# Altium footprint library FOC.PcbLib: 148 footprints (part 5 of 10)
Each footprint in its own frame and in the unit in brackets; x right, y up, seen from the top. Pads: shape width x height; smd on the part's side, far side on the other; paste and mask are expansions set on the pad; w line width, h text height; cw(c..) or ccw(c..) is an arc to the next point about the centre after c.
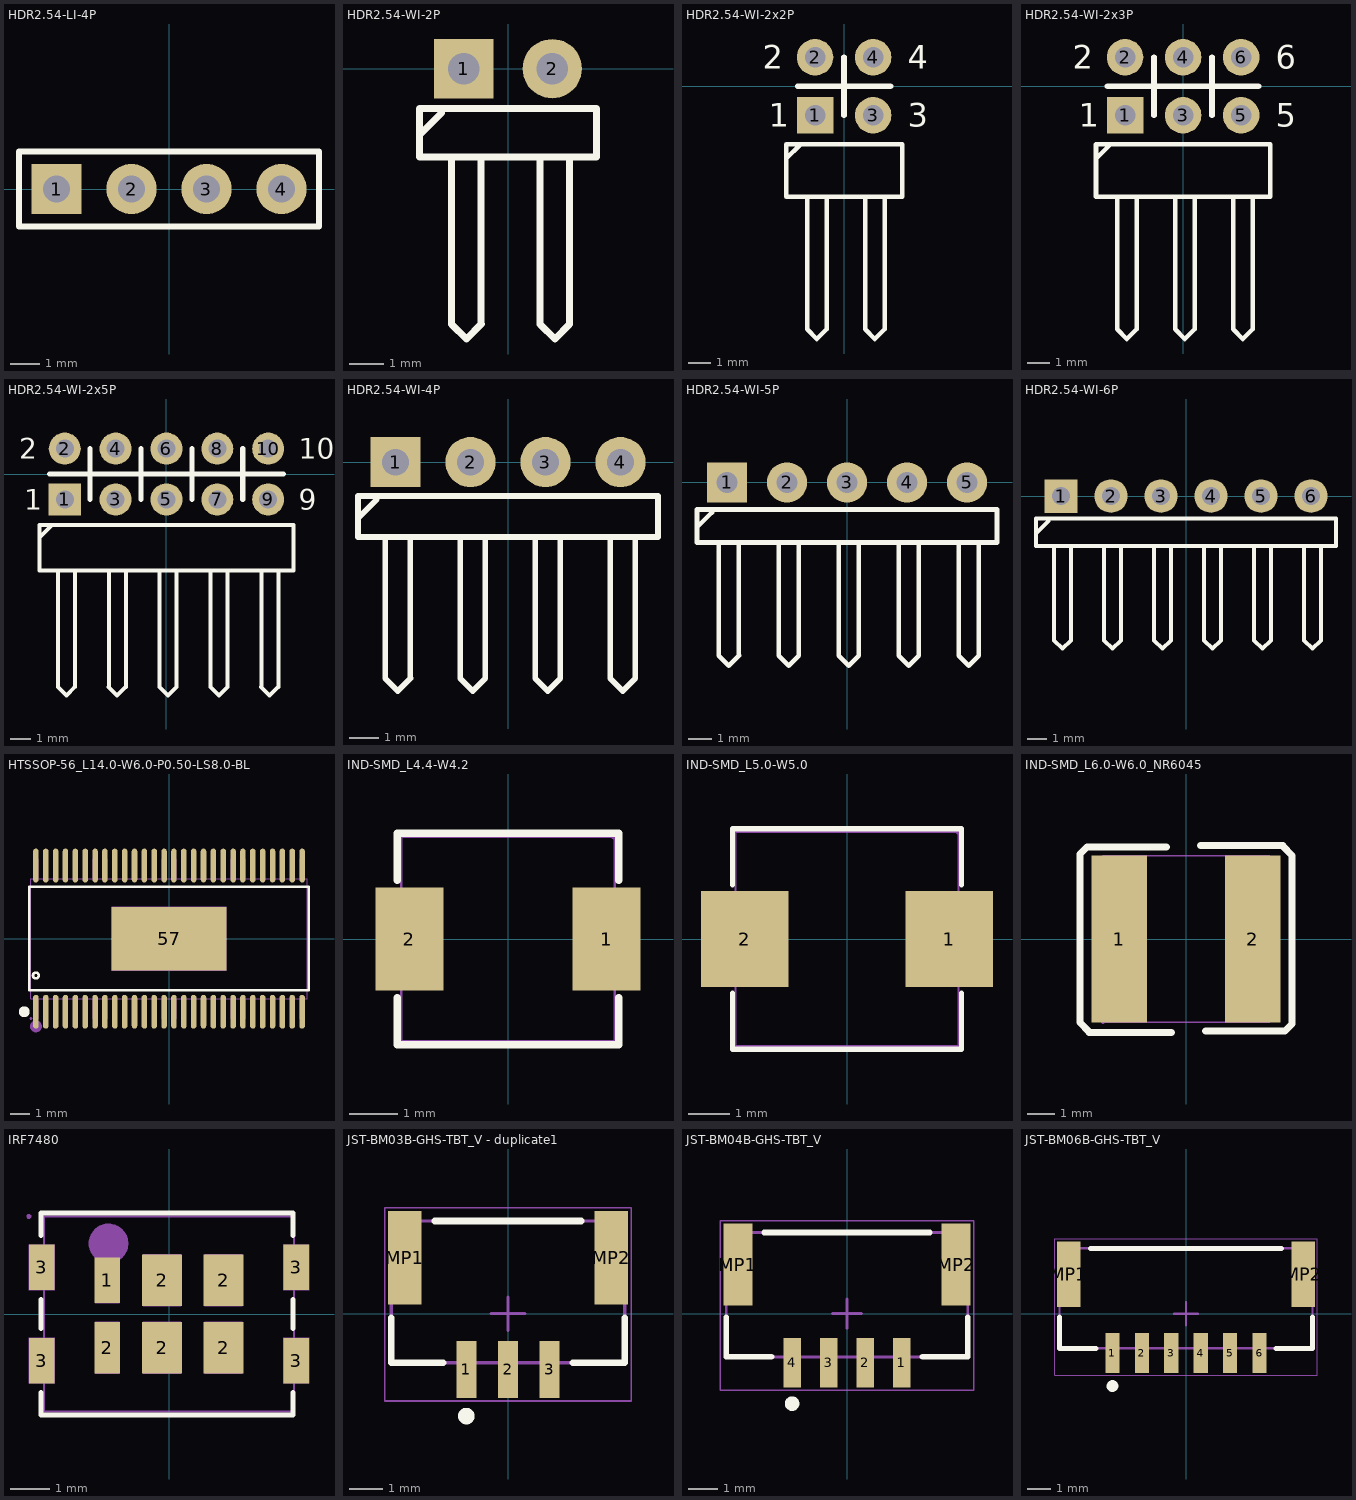
[diagram p4: the footprints below, top view; thin cyan lines are the x and y axes]

## HDR2.54-LI-4P [mm] "排针，4脚"
pads (4):
  rect 1.7x1.7 hole 0.9: 1(-3.81,0)
  round 1.7 hole 0.9: 2(-1.27,0) 3(1.27,0) 4(3.81,0)
Top Overlay:
  lines w0.2: -5.08,-1.27 5.08,-1.27 5.08,1.27 -5.08,1.27 -5.08,-1.27
3D body "HDR2.54-1P.STEP": height 2.54, standoff -8.96, extent -5.08,-1.27 -2.54,1.27
3D body "HDR2.54-1P.STEP": height 2.54, standoff -8.96, extent -2.54,-1.27 0,1.27
3D body "HDR2.54-1P.STEP": height 2.54, standoff -8.96, extent 0,-1.27 2.54,1.27
3D body "HDR2.54-1P.STEP": height 2.54, standoff -8.96, extent 2.54,-1.27 5.08,1.27

## HDR2.54-WI-2P [mm] "弯脚排针，2脚"
pads (2):
  rect 1.7x1.7 hole 0.9: 1(-1.27,0)
  round 1.7 hole 0.9: 2(1.27,0)
Top Overlay:
  lines w0.2: -2.54,-1.905 -1.905,-1.27 ; -1.618,-2.54 -1.618,-7.332 -1.195,-7.755 -0.771,-7.332 -0.762,-7.323 ; -0.771,-7.323 -0.771,-2.54 ; 0.922,-2.54 0.922,-7.332 1.345,-7.755 1.769,-7.332 ; 1.769,-7.323 1.769,-2.54 ; -2.54,-2.54 2.54,-2.54 2.54,-1.143 -0.762,-1.143 -2.54,-1.143 -2.54,-2.54
3D body "HDR2.54-1P_H.STEP": height 4.85, standoff -3, extent -2.54,-7.77 0,1.27
3D body "HDR2.54-1P_H.STEP": height 4.85, standoff -3, extent 0,-7.77 2.54,1.27

## HDR2.54-WI-2x2P [mm] "双排弯脚排针，2x2脚"
pads (4):
  rect 1.6x1.6 hole 0.9: 1(-1.27,-1.27)
  round 1.6 hole 0.9: 2(-1.27,1.27) 3(1.27,-1.27) 4(1.27,1.27)
Top Overlay:
  lines w0.2: -2.54,-3.175 -1.905,-2.54 ; -1.618,-10.634 -1.195,-11.057 -0.771,-10.634 -0.762,-10.625 -0.762,-4.826 ; -1.609,-10.634 -1.609,-4.826 ; 0.922,-10.634 1.345,-11.057 1.769,-10.634 ; 0.931,-10.634 0.931,-4.826 ; 1.778,-10.634 1.778,-4.826 ; -2.54,-4.826 -2.54,-2.54 2.54,-2.54 2.54,-4.826 -2.54,-4.826
  lines w0.254: -2.032,0 2.032,0 ; 0,-1.27 0,1.27
  text "3" at 2.794,-1.778 h1.02
  text "4" at 2.794,0.762 h1.02
  text "2" at -3.556,0.762 h1.02
  text "1" at -3.302,-1.778 h1.02
Bottom Overlay:
  lines w0.254: -2.032,0 2.032,0 ; 0,-1.27 0,1.27
3D body "HDR-1x2_H.STEP": height 5.1, standoff -3, extent -2.54,-11.23 0,1.62
3D body "HDR-1x2_H.STEP": height 5.1, standoff -3, extent 0,-11.23 2.54,1.62

## HDR2.54-WI-2x3P [mm] "双排弯脚排针，3x2脚"
pads (6):
  rect 1.6x1.6 hole 0.9: 1(-2.54,-1.27)
  round 1.6 hole 0.9: 2(-2.54,1.27) 3(0,-1.27) 4(0,1.27) 5(2.54,-1.27) 6(2.54,1.27)
Top Overlay:
  lines w0.2: -3.81,-3.175 -3.175,-2.54 ; -2.888,-10.634 -2.465,-11.057 -2.041,-10.634 -2.032,-10.625 -2.032,-4.826 ; -2.879,-10.634 -2.879,-4.826 ; -0.348,-10.634 0.075,-11.057 0.499,-10.634 ; -0.339,-10.634 -0.339,-4.826 ; 0.508,-10.634 0.508,-4.826 ; 2.192,-10.634 2.615,-11.057 3.039,-10.634 ; 2.201,-10.634 2.201,-4.826 ; 3.048,-10.634 3.048,-4.826 ; -3.81,-4.826 3.81,-4.826 3.81,-2.54 -3.81,-2.54 -3.81,-4.826
  lines w0.254: -3.302,0 3.302,0 ; -1.27,-1.27 -1.27,1.27 ; 1.27,-1.27 1.27,1.27
  text "6" at 4.064,0.762 h1.02
  text "5" at 4.064,-1.778 h1.02
  text "2" at -4.826,0.762 h1.02
  text "1" at -4.572,-1.778 h1.02
Bottom Overlay:
  lines w0.254: -3.302,0 3.302,0 ; -1.27,-1.27 -1.27,1.27 ; 1.27,-1.27 1.27,1.27
3D body "HDR-1x2_H.STEP": height 5.1, standoff -3, extent -1.27,-11.23 1.27,1.62
3D body "HDR-1x2_H.STEP": height 5.1, standoff -3, extent -3.81,-11.23 -1.27,1.62
3D body "HDR-1x2_H.STEP": height 5.1, standoff -3, extent 1.27,-11.23 3.81,1.62

## HDR2.54-WI-2x5P [mm] "双排弯脚排针，5x2脚"
pads (10):
  rect 1.6x1.6 hole 0.9: 1(-5.08,-1.27)
  round 1.6 hole 0.9: 2(-5.08,1.27) 3(-2.54,-1.27) 4(-2.54,1.27) 5(0,-1.27) 6(0,1.27) 7(2.54,-1.27) 8(2.54,1.27) 9(5.08,-1.27) 10(5.08,1.27)
Top Overlay:
  lines w0.2: -6.35,-3.175 -5.715,-2.54 ; -5.428,-10.634 -5.005,-11.057 -4.581,-10.634 -4.572,-10.625 -4.572,-4.826 ; -5.419,-10.634 -5.419,-4.826 ; -2.888,-10.634 -2.465,-11.057 -2.041,-10.634 ; -2.879,-10.634 -2.879,-4.826 ; -2.032,-10.634 -2.032,-4.826 ; -0.348,-10.634 0.075,-11.057 0.499,-10.634 ; -0.339,-10.634 -0.339,-4.826 ; 0.508,-10.634 0.508,-4.826 ; 2.192,-10.634 2.615,-11.057 3.039,-10.634 ; 2.201,-10.634 2.201,-4.826 ; 3.048,-10.634 3.048,-4.826 ; 4.732,-10.634 5.155,-11.057 5.579,-10.634 ; 4.741,-10.634 4.741,-4.826 ; 5.588,-10.634 5.588,-4.826 ; -6.35,-4.826 -6.35,-2.54 6.35,-2.54 6.35,-4.826 -6.35,-4.826
  lines w0.254: -5.842,0 5.842,0 ; -3.81,-1.27 -3.81,1.27 ; -1.27,-1.27 -1.27,1.27 ; 1.27,-1.27 1.27,1.27 ; 3.81,-1.27 3.81,1.27
  text "10" at 6.604,0.762 h1.02
  text "9" at 6.604,-1.778 h1.02
  text "1" at -7.112,-1.778 h1.02
  text "2" at -7.366,0.762 h1.02
Bottom Overlay:
  lines w0.254: -5.842,0 5.842,0 ; -3.81,-1.27 -3.81,1.27 ; -1.27,-1.27 -1.27,1.27 ; 1.27,-1.27 1.27,1.27 ; 3.81,-1.27 3.81,1.27
3D body "HDR-1x2_H.STEP": height 5.1, standoff -3, extent -3.81,-11.23 -1.27,1.62
3D body "HDR-1x2_H.STEP": height 5.1, standoff -3, extent -6.35,-11.23 -3.81,1.62
3D body "HDR-1x2_H.STEP": height 5.1, standoff -3, extent 1.27,-11.23 3.81,1.62
3D body "HDR-1x2_H.STEP": height 5.1, standoff -3, extent -1.27,-11.23 1.27,1.62
3D body "HDR-1x2_H.STEP": height 5.1, standoff -3, extent 3.81,-11.23 6.35,1.62

## HDR2.54-WI-4P [mm] "弯脚排针，4脚"
pads (4):
  rect 1.7x1.7 hole 0.9: 1(-3.81,0)
  round 1.7 hole 0.9: 2(-1.27,0) 3(1.27,0) 4(3.81,0)
Top Overlay:
  lines w0.2: -5.08,-1.905 -4.445,-1.27 ; -4.158,-2.54 -4.158,-7.332 -3.735,-7.755 -3.311,-7.332 -3.302,-7.323 ; -3.311,-7.323 -3.311,-2.54 ; -1.618,-2.54 -1.618,-7.332 -1.195,-7.755 -0.771,-7.332 ; -0.771,-7.323 -0.771,-2.54 ; 0.922,-2.54 0.922,-7.332 1.345,-7.755 1.769,-7.332 ; 1.769,-7.323 1.769,-2.54 ; 3.462,-2.54 3.462,-7.332 3.885,-7.755 4.309,-7.332 ; 4.309,-7.323 4.309,-2.54 ; -5.08,-2.54 5.08,-2.54 5.08,-1.143 -3.302,-1.143 -5.08,-1.143 -5.08,-2.54
3D body "HDR2.54-1P_H.STEP": height 4.85, standoff -3, extent 2.54,-7.77 5.08,1.27
3D body "HDR2.54-1P_H.STEP": height 4.85, standoff -3, extent 0,-7.77 2.54,1.27
3D body "HDR2.54-1P_H.STEP": height 4.85, standoff -3, extent -2.54,-7.77 0,1.27
3D body "HDR2.54-1P_H.STEP": height 4.85, standoff -3, extent -5.08,-7.77 -2.54,1.27

## HDR2.54-WI-5P [mm] "弯脚排针，5脚"
pads (5):
  rect 1.7x1.7 hole 0.9: 1(-5.08,0)
  round 1.7 hole 0.9: 2(-2.54,0) 3(0,0) 4(2.54,0) 5(5.08,0)
Top Overlay:
  lines w0.2: -6.35,-1.905 -5.715,-1.27 ; -5.428,-2.54 -5.428,-7.332 -5.005,-7.755 -4.581,-7.332 -4.572,-7.323 ; -4.581,-7.323 -4.581,-2.54 ; -2.888,-2.54 -2.888,-7.332 -2.465,-7.755 -2.041,-7.332 ; -2.041,-7.323 -2.041,-2.54 ; -0.348,-2.54 -0.348,-7.332 0.075,-7.755 0.499,-7.332 ; 0.499,-7.323 0.499,-2.54 ; 2.192,-2.54 2.192,-7.332 2.615,-7.755 3.039,-7.332 ; 3.039,-7.323 3.039,-2.54 ; 4.732,-2.54 4.732,-7.332 5.155,-7.755 5.579,-7.332 ; 5.579,-7.323 5.579,-2.54 ; -6.35,-2.54 6.35,-2.54 6.35,-1.143 -4.572,-1.143 -6.35,-1.143 -6.35,-2.54
3D body "HDR2.54-1P_H.STEP": height 4.85, standoff -3, extent -6.35,-7.77 -3.81,1.27
3D body "HDR2.54-1P_H.STEP": height 4.85, standoff -3, extent -3.81,-7.77 -1.27,1.27
3D body "HDR2.54-1P_H.STEP": height 4.85, standoff -3, extent -1.27,-7.77 1.27,1.27
3D body "HDR2.54-1P_H.STEP": height 4.85, standoff -3, extent 1.27,-7.77 3.81,1.27
3D body "HDR2.54-1P_H.STEP": height 4.85, standoff -3, extent 3.81,-7.77 6.35,1.27

## HDR2.54-WI-6P [mm] "弯脚排针，6脚"
pads (6):
  rect 1.7x1.7 hole 0.9: 1(-6.35,0)
  round 1.7 hole 0.9: 2(-3.81,0) 3(-1.27,0) 4(1.27,0) 5(3.81,0) 6(6.35,0)
Top Overlay:
  lines w0.2: -7.62,-1.905 -6.985,-1.27 ; -6.698,-2.54 -6.698,-7.332 -6.275,-7.755 -5.851,-7.332 -5.842,-7.323 ; -5.851,-7.323 -5.851,-2.54 ; -4.158,-2.54 -4.158,-7.332 -3.735,-7.755 -3.311,-7.332 ; -3.311,-7.323 -3.311,-2.54 ; -1.618,-2.54 -1.618,-7.332 -1.195,-7.755 -0.771,-7.332 ; -0.771,-7.323 -0.771,-2.54 ; 0.922,-2.54 0.922,-7.332 1.345,-7.755 1.769,-7.332 ; 1.769,-7.323 1.769,-2.54 ; 3.462,-2.54 3.462,-7.332 3.885,-7.755 4.309,-7.332 ; 4.309,-7.323 4.309,-2.54 ; 6.002,-2.54 6.002,-7.332 6.425,-7.755 6.849,-7.332 ; 6.849,-7.323 6.849,-2.54 ; -7.62,-2.54 7.62,-2.54 7.62,-1.143 -5.842,-1.143 -7.62,-1.143 -7.62,-2.54
3D body "HDR2.54-1P_H.STEP": height 4.85, standoff -3, extent -7.62,-7.77 -5.08,1.27
3D body "HDR2.54-1P_H.STEP": height 4.85, standoff -3, extent -5.08,-7.77 -2.54,1.27
3D body "HDR2.54-1P_H.STEP": height 4.85, standoff -3, extent -2.54,-7.77 0,1.27
3D body "HDR2.54-1P_H.STEP": height 4.85, standoff -3, extent 0,-7.77 2.54,1.27
3D body "HDR2.54-1P_H.STEP": height 4.85, standoff -3, extent 2.54,-7.77 5.08,1.27
3D body "HDR2.54-1P_H.STEP": height 4.85, standoff -3, extent 5.08,-7.77 7.62,1.27

## HTSSOP-56_L14.0-W6.0-P0.50-LS8.0-BL [mm] "DRV8301"
pads (57):
  oval 0.28x1.715 smd mask+0.051: 1(-6.75,-3.708) 2(-6.25,-3.708) 3(-5.75,-3.708) 4(-5.25,-3.708) 5(-4.75,-3.708) 6(-4.25,-3.708) 7(-3.75,-3.708) 8(-3.25,-3.708) 9(-2.75,-3.708) 10(-2.25,-3.708) 11(-1.75,-3.708) 12(-1.25,-3.708) 13(-0.75,-3.708) 14(-0.25,-3.708) 15(0.25,-3.708) 16(0.75,-3.708) 17(1.25,-3.708) 18(1.75,-3.708) 19(2.25,-3.708) 20(2.75,-3.708) 21(3.25,-3.708) 22(3.75,-3.708) 23(4.25,-3.708) 24(4.75,-3.708) 25(5.25,-3.708) 26(5.75,-3.708) 27(6.25,-3.708) 28(6.75,-3.708) 29(6.75,3.708) 30(6.25,3.708) 31(5.75,3.708) 32(5.25,3.708) 33(4.75,3.708) 34(4.25,3.708) 35(3.75,3.708) 36(3.25,3.708) 37(2.75,3.708) 38(2.25,3.708) 39(1.75,3.708) 40(1.25,3.708) 41(0.75,3.708) 42(0.25,3.708) 43(-0.25,3.708) 44(-0.75,3.708) 45(-1.25,3.708) 46(-1.75,3.708) 47(-2.25,3.708) 48(-2.75,3.708) 49(-3.25,3.708) 50(-3.75,3.708) 51(-4.25,3.708) 52(-4.75,3.708) 53(-5.25,3.708) 54(-5.75,3.708) 55(-6.25,3.708) 56(-6.75,3.708)
  rect 5.825x3.235 smd mask+0.051: 57(0,0)
Top Overlay:
  circle w0.3: c-7.342,-3.708 r0.127
  circle w0.127: c-6.75,-1.869 r0.15
  lines w0.127: -7.076,-2.621 7.076,-2.621 7.076,2.622 -7.076,2.622 -7.076,-2.621
Mechanical 6:
  circle w0.3: c-6.75,-4.45 r0.15
Mechanical 15:
  drawing of 118 lines, arcs and shapes, not listed
3D body "User Library-HTSSOP-56.STEP": height 1.1, standoff 0, extent -7,-4.1 7,4.1

## IND-SMD_L4.4-W4.2 [mm]
pads (2):
  rect 1.4x2.12 smd: 1(2.028,0) 2(-2.028,0)
Top Overlay:
  lines w0.152: -2.276,-1.212 -2.276,-2.176 2.276,-2.176 2.276,-1.212 ; -2.276,1.212 -2.276,2.176 2.276,2.176 2.276,1.212
Mechanical 15:
  region: 2.26,2.1 2.26,2.125 2.225,2.16 2.175,2.16 2.14,2.125 2.14,2.1 2.14,2.075 2.175,2.04 2.225,2.04 2.26,2.075
  region: 1.4,1 2.2,1 2.2,-1 1.4,-1
  region: -2.2,1 -1.4,1 -1.4,-1 -2.2,-1
  lines w0.051: -2.2,-2.1 -2.2,2.1 2.2,2.1 2.2,-2.1 -2.2,-2.1
3D body "SMD,4.4x4.2mm.STEP": height 1.2, standoff -0.01, extent -2.225,-2.04 2.225,2.03

## IND-SMD_L5.0-W5.0 [mm]
pads (2):
  rect 2.124x2.32 smd: 1(2.478,0) 2(-2.478,0)
Top Overlay:
  lines w0.127: -2.776,-1.312 -2.776,-2.676 2.776,-2.676 2.776,-1.312 ; -2.776,1.312 -2.776,2.676 2.776,2.676 2.776,1.312
Mechanical 15:
  region: -2.7,1 -1.7,1 -1.7,-1 -2.7,-1
  region: 1.7,1 2.7,1 2.7,-1 1.7,-1
  region: 2.76,2.6 2.76,2.625 2.725,2.66 2.675,2.66 2.64,2.625 2.64,2.6 2.64,2.575 2.675,2.54 2.725,2.54 2.76,2.575
  lines w0.051: -2.7,-2.6 2.7,-2.6 2.7,2.6 -2.7,2.6 -2.7,-2.6
3D body "inc.STEP": height 2.11, standoff -0.01, extent -2.524,-2.509 2.496,2.491

## IND-SMD_L6.0-W6.0_NR6045 [mm]
pads (2):
  rect 2x6 smd mask+0.051: 1(-2.4,0) 2(2.4,0)
Top Overlay:
  lines w0.254: -0.71,3.31 -3.57,3.31 -3.82,3.06 -3.82,2.94 -3.82,-3.01 -3.49,-3.34 -3.49,-3.36 -0.53,-3.36 ; 0.53,3.36 3.49,3.36 3.49,3.34 3.82,3.01 3.82,-2.94 3.82,-3.06 3.57,-3.31 0.71,-3.31
Mechanical 15:
  region: -2.931,-2.996 -2.931,-2.971 -2.966,-2.936 -3.016,-2.936 -3.051,-2.971 -3.051,-2.996 -3.051,-3.021 -3.016,-3.056 -2.966,-3.056 -2.931,-3.021
  region: -2.991,2.5 -1.991,2.5 -1.991,-2.5 -2.991,-2.5
  region: 2.009,2.5 3.009,2.5 3.009,-2.5 2.009,-2.5
  lines w0.051: -2.991,-2.996 -2.991,3.004 3.009,3.004 3.009,-2.996 -2.991,-2.996

## IRF7480 [mm]
pads (10):
  rect 0.65x1.15 smd mask+0.051: 1(-1.555,0.85) 3(-3.205,-1.175) 3(-3.205,1.175) 3(3.205,-1.175) 3(3.205,1.175)
  rect 0.65x1.3 smd mask+0.051: 2(-1.555,-0.85)
  rect 1x1.3 smd mask+0.051: 2(-0.175,-0.85) 2(-0.175,0.85) 2(1.375,-0.85) 2(1.375,0.85)
Top Overlay:
  lines w0.127: -3.223,-1.981 -3.223,-2.54 3.127,-2.54 3.127,-1.981 ; -3.223,-0.369 -3.223,0.369 ; -3.223,1.981 -3.223,2.54 3.127,2.54 3.127,1.981 ; 3.127,-0.369 3.127,0.369
Mechanical 6:
  circle w0.5: c-1.524,1.778 r0.25
Mechanical 15:
  region: -3.47,2.46 -3.47,2.485 -3.505,2.52 -3.555,2.52 -3.59,2.485 -3.59,2.46 -3.59,2.435 -3.555,2.4 -3.505,2.4 -3.47,2.435
  region: -3.53,1.75 -2.88,1.75 -2.88,0.6 -3.53,0.6
  region: -3.53,-0.6 -2.88,-0.6 -2.88,-1.75 -3.53,-1.75
  region: 2.88,-0.6 3.53,-0.6 3.53,-1.75 2.88,-1.75
  region: 2.88,1.75 3.53,1.75 3.53,0.6 2.88,0.6
  region: -0.65,1.5 0.3,1.5 0.3,0.2 -0.65,0.2
  region: 0.9,1.5 1.85,1.5 1.85,0.2 0.9,0.2
  region: 0.9,-0.2 1.85,-0.2 1.85,-1.5 0.9,-1.5
  region: -0.65,-0.2 0.3,-0.2 0.3,-1.5 -0.65,-1.5
  region: -1.855,-0.2 -1.255,-0.2 -1.255,-1.5 -1.855,-1.5
  region: -1.855,1.425 -1.255,1.425 -1.255,0.275 -1.855,0.275
  lines w0.051: -3.15,-2.46 3.15,-2.46 3.15,2.46 -3.15,2.46 -3.15,-2.46
3D body "IRF7480.STEP": height 0.6, standoff -0.14, extent -3.15,-2.45 3.15,2.45

## JST-BM03B-GHS-TBT_V - duplicate1 [mm] "Connector, 3-Leads, Body 7.00x4.25mm, Pitch 1.25mm"
height 4.05
pads (5):
  rect 0.6x1.7 smd: 1(-1.25,-1.675) 2(0,-1.675) 3(1.25,-1.675)
  rect 1x2.8 smd: MP1(-3.1,1.675) MP2(3.1,1.675)
Top Overlay:
  circle w0.25: c-1.25,-3.075 r0.125
  lines w0.2: -3.5,-0.125 -3.5,-1.475 -1.95,-1.475 ; -2.2,2.775 2.2,2.775 ; 1.95,-1.475 3.5,-1.475 3.5,-0.125
Mechanical 13:
  lines w0.1: -3.5,-1.475 -3.5,2.775 3.5,2.775 3.5,-1.475 -3.5,-1.475
Mechanical 15:
  lines w0.05: -3.7,-2.625 -3.7,3.175 3.7,3.175 3.7,-2.625 -3.7,-2.625
  lines w0.1: -0.5,0 0.5,0 ; 0,-0.5 0,0.5
3D body "BM03B-GHS-TBT.STEP": height 4.21, standoff 0.01, extent -3.5,-2.175 3.5,2.775

## JST-BM04B-GHS-TBT_V [mm] "Connector, 4-Leads, Body 8.25x4.25mm, Pitch 1.25mm"
height 4.05
pads (6):
  rect 0.6x1.7 smd: 1(1.875,-1.675) 2(0.625,-1.675) 3(-0.625,-1.675) 4(-1.875,-1.675)
  rect 1x2.8 smd: MP1(-3.725,1.675) MP2(3.725,1.675)
Top Overlay:
  circle w0.25: c-1.875,-3.075 r0.125
  lines w0.2: -4.125,-0.125 -4.125,-1.475 -2.575,-1.475 ; -2.825,2.775 2.825,2.775 ; 2.575,-1.475 4.125,-1.475 4.125,-0.125
Mechanical 13:
  lines w0.1: -4.125,-1.475 -4.125,2.775 4.125,2.775 4.125,-1.475 -4.125,-1.475
Mechanical 15:
  lines w0.05: -4.325,-2.625 -4.325,3.175 4.325,3.175 4.325,-2.625 -4.325,-2.625
  lines w0.1: -0.5,0 0.5,0 ; 0,-0.5 0,0.5
3D body "BM04B-GHS-TBT.STEP": height 4.2, standoff 0, extent -4.125,-2.175 4.125,2.775

## JST-BM06B-GHS-TBT_V [mm] "Connector, 6-Leads, Body 10.75x4.25mm, Pitch 1.25mm"
height 4.05
pads (8):
  rect 0.6x1.7 smd: 1(-3.125,-1.675) 2(-1.875,-1.675) 3(-0.625,-1.675) 4(0.625,-1.675) 5(1.875,-1.675) 6(3.125,-1.675)
  rect 1x2.8 smd: MP1(-4.975,1.675) MP2(4.975,1.675)
Top Overlay:
  circle w0.25: c-3.125,-3.075 r0.125
  lines w0.2: -5.375,-0.125 -5.375,-1.475 -3.825,-1.475 ; -4.075,2.775 4.075,2.775 ; 3.825,-1.475 5.375,-1.475 5.375,-0.125
Mechanical 13:
  lines w0.1: -5.375,-1.475 -5.375,2.775 5.375,2.775 5.375,-1.475 -5.375,-1.475
Mechanical 15:
  lines w0.05: -5.575,-2.625 -5.575,3.175 5.575,3.175 5.575,-2.625 -5.575,-2.625
  lines w0.1: -0.5,0 0.5,0 ; 0,-0.5 0,0.5
3D body "BM06B-GHS-TBT.STEP": height 4.2, standoff 0, extent -5.375,-2.175 5.375,2.775